# Altium footprint library 元件1.PcbLib: 420 footprints (part 18 of 27)
Each footprint in its own frame and in the unit in brackets; x right, y up, seen from the top. Pads: shape width x height; smd on the part's side, far side on the other; paste and mask are expansions set on the pad; w line width, h text height; cw(c..) or ccw(c..) is an arc to the next point about the centre after c.
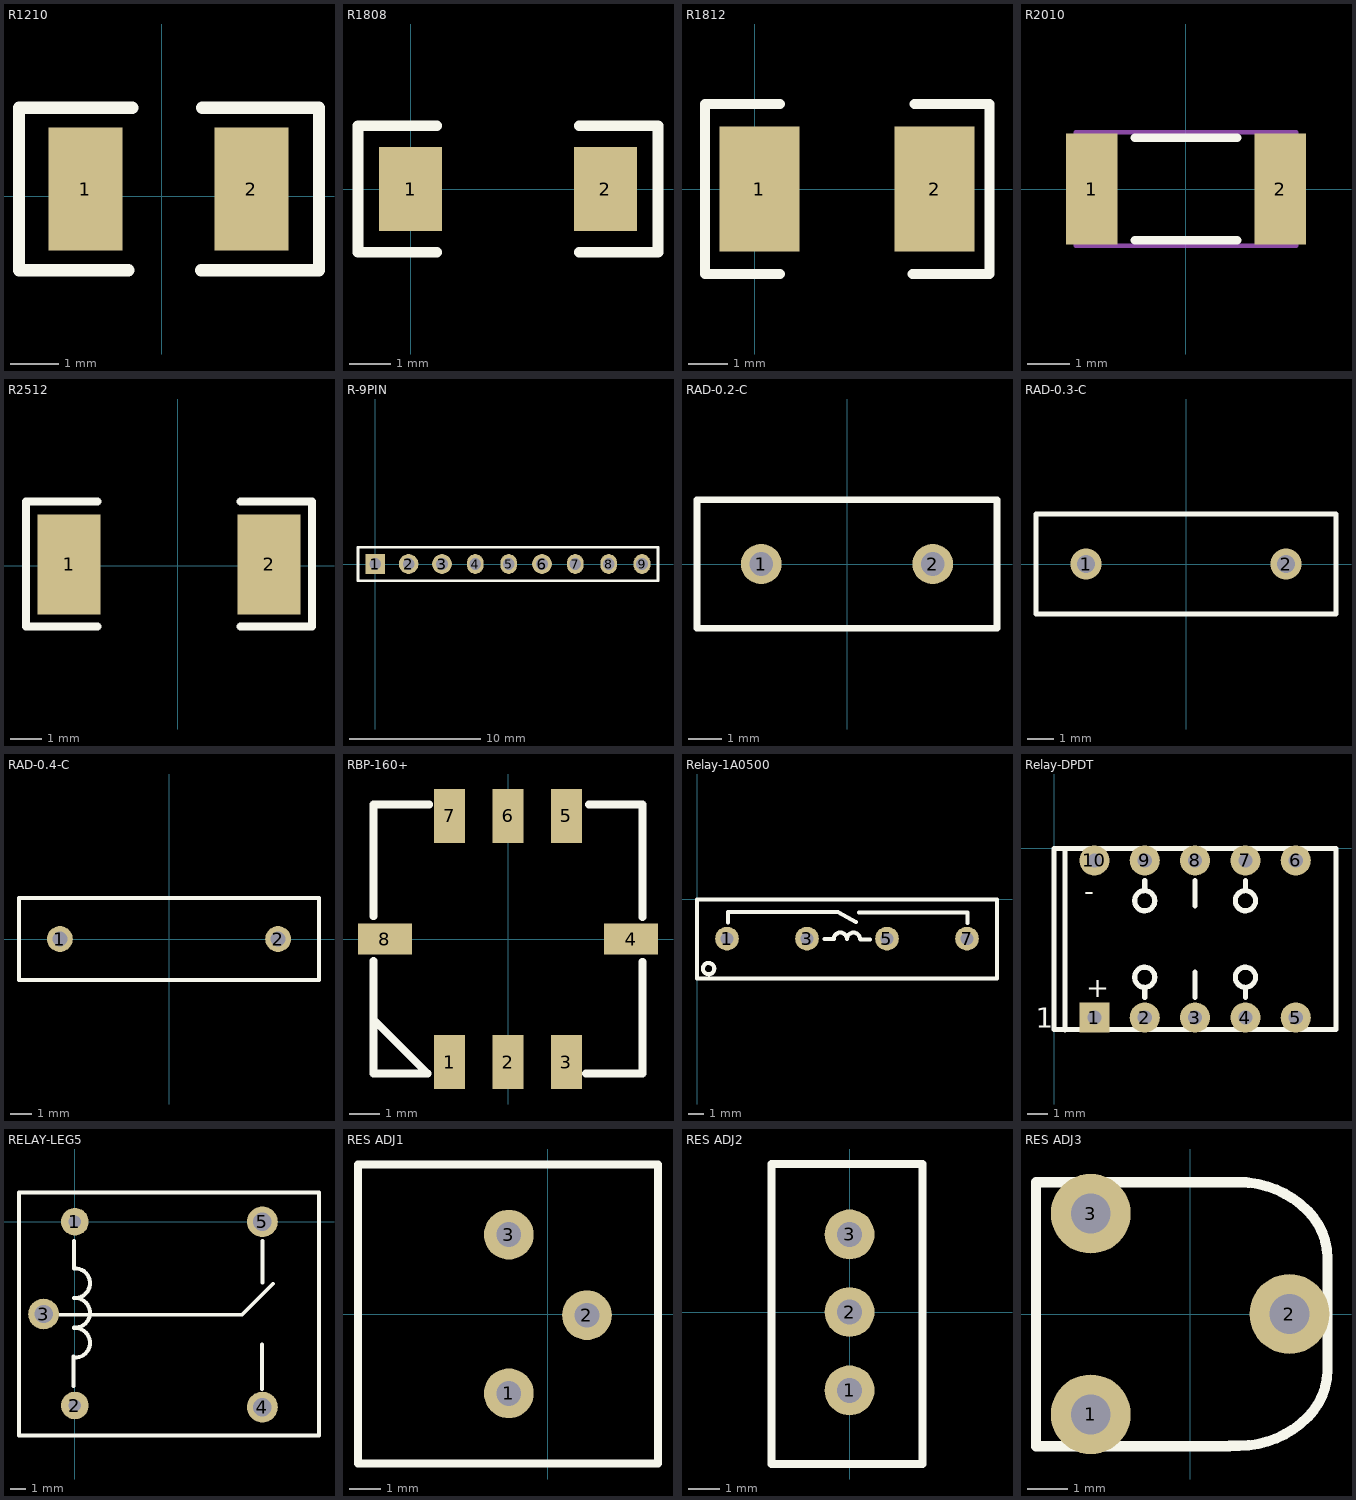
[diagram p17: the footprints below, top view; thin cyan lines are the x and y axes]

## R1210 [mil] "1/3W"
pads (2):
  rect 60x100 smd: 1(-62,6) 2(73,6)
Top Overlay:
  lines w10: -27,-60 -116,-60 -116,72 -24,72 ; 32,-60 128,-60 128,72 ; 33,72 126.8,72
3D body "1210(3225M) Cap.STEP": height 67.1, standoff 0, extent -72.75,-44 84.75,54

## R1808 [mil]
pads (2):
  rect 60x80 smd: 1(0,0) 2(185,0)
Top Overlay:
  lines w10: 25,-60 -50,-60 -50,60 25,60 ; 160,-60 235,-60 235,60 160,60
3D body "R1808(4520M)1.STEP": height 39.37, standoff 0, extent 2,-39 179.77,37.49

## R1812 [mil] "1/2W"
pads (2):
  rect 80x125 smd: 1(4.39,-0.02) 2(180,-0.02)
Top Overlay:
  lines w10: 25,-85 -50,-85 -50,85 25,85 ; 158,-85 160,-85 235,-85 235,85 160,85 ; 159,-85 161,-85
3D body "1812 SMD Resistor.step": height 63.07, standoff 0, extent 5.42,-62 182.58,63.98

## R2010 [mm] "3/4W"
height 0.9
pads (2):
  rect 1.2x2.6 smd: 1(-2.2,0) 2(2.2,0)
Top Overlay:
  lines w0.2: -1.2,-1.2 1.2,-1.2 ; -1.2,1.2 1.2,1.2
Mechanical 13:
  lines w0.1: -2.575,-1.325 -2.575,1.325 2.575,1.325 2.575,-1.325 -2.575,-1.325
3D body "User Library-res2010.STEP": height 0.57, standoff -0.05, extent -3,-1.35 3,1.35

## R2512 [mm] "1W"
height 0.9
pads (2):
  rect 2x3.2 smd: 1(-3.479,0.051) 2(2.921,0.051)
Top Overlay:
  lines w0.254: -2.565,-1.93 -4.851,-1.93 -4.851,2.057 -2.565,2.057 ; 2.007,-1.93 4.293,-1.93 4.293,2.057 2.007,2.057
3D body "RESC6432X06.step": height 0.6, standoff 0, extent -3.479,-1.549 2.921,1.651

## R-9PIN [mm]
pads (9):
  rect 1.5x1.5 hole 0.9: 1(0,0)
  round 1.5 hole 0.9: 2(2.54,0) 3(5.08,0) 6(12.7,0)
  oval 1.27x1.5 hole 0.9: 4(7.62,0) 5(10.16,0) 7(15.24,0) 8(17.78,0) 9(20.32,0)
Top Overlay:
  lines w0.2: -1.321,-1.27 -1.321,1.27 21.539,1.27 21.539,-1.27 -1.321,-1.27
3D body "pai zu.STEP": height 5.3, standoff -3.2, extent -1.012,-0.635 21.488,0.615

## RAD-0.2-C [mm] "Radial Cap, Thru-Hole; 2 Leads; 0.2 in Pin Spacing"
pads (2):
  round 1.2 hole 0.7: 1(-2.54,0) 2(2.54,0)
Top Overlay:
  lines w0.2: -4.445,-1.905 -4.445,1.905 4.445,1.905 4.445,-1.905 -4.445,-1.905
3D body "SW3dPS-capacitor-radial.STEP": height 6.14, standoff -1.48, extent -2.794,-1.016 2.794,1.27

## RAD-0.3-C [mm] "Radial Cap, Thru-Hole; 2 Leads; 0.3 in Pin Spacing"
height 6
pads (2):
  round 1.2 hole 0.7: 1(-3.81,0) 2(3.81,0)
Top Overlay:
  lines w0.2: -5.715,-1.905 5.715,-1.905 5.715,1.905 -5.715,1.905 -5.715,-1.905
3D body "User Library-RAD CAP 12_5MM.STEP": height 14.62, standoff -5.79, extent -6.377,-2.921 6.123,2.979

## RAD-0.4-C [mm] "Radial Cap, Thru-Hole; 2 Leads; 0.4 in Pin Spacing"
pads (2):
  round 1.2 hole 0.7: 1(-5.08,0) 2(5.08,0)
Top Overlay:
  lines w0.2: -6.985,-1.905 6.985,-1.905 6.985,1.905 -6.985,1.905 -6.985,-1.905
3D body "User Library-RAD CAP 12_5MM.STEP": height 16.47, standoff -3.94, extent -6.25,-2.979 6.25,2.921

## RBP-160+ [mm] "IF SAW FILTER"
height 5.33
pads (8):
  rect 1.02x1.78 smd: 1(-1.93,-4.065) 2(0,-4.065) 3(1.93,-4.065) 5(1.93,4.065) 6(0,4.065) 7(-1.93,4.065)
  rect 1.78x1.02 smd: 4(4.065,0) 8(-4.065,0)
Top Overlay:
  lines w0.254: -4.445,-4.191 -4.445,-0.725 ; -4.445,-3.275 -4.445,-4.445 -2.65,-4.445 -4.445,-2.65 -4.445,-2.325 ; -4.445,0.75 -4.445,4.445 -2.6,4.445 ; 2.575,-4.445 4.445,-4.445 4.445,-0.75 ; 2.675,4.445 4.191,4.445 4.445,4.445 ; 3.35,4.445 4.445,4.445 ; 4.445,0.725 4.445,4.445
3D body "RBP-275 .step": height 2.54, standoff 0, extent -4.455,-4.455 4.455,4.455

## Relay-1A0500 [mm]
pads (4):
  round 1.5 hole 0.8: 1(1.905,-2.489) 3(6.985,-2.489) 5(12.065,-2.489) 7(17.145,-2.489)
Top Overlay:
  circle w0.254: c0.737,-4.394 r0.359
  lines w0.254: 1.981,-1.473 1.981,-0.813 8.966,-0.813 10.109,-1.448 ; 8.103,-2.515 8.687,-2.515 cw(c9.093,-2.515) 9.093,-2.108 cw(c9.093,-2.54) 9.524,-2.516 ; 9.526,-2.515 cw(c9.932,-2.515) 9.932,-2.108 cw(c9.932,-2.54) 10.363,-2.516 ; 10.287,-0.838 17.17,-0.838 17.17,-1.499 ; 10.389,-2.54 10.973,-2.54 ; 0,-5.029 0,0 19.05,0 19.05,-5.029 0,-5.029
3D body "SIL03-1A72-71L_WEB.step": height 8.15, standoff -3.15, extent -0.374,-5.054 19.426,0.026

## Relay-DPDT [mm]
pads (10):
  rect 1.5x1.5 hole 0.7: 1(2,-8.4)
  round 1.5 hole 0.7: 2(4.5,-8.4) 3(7,-8.4) 4(9.5,-8.4) 5(12,-8.4) 6(12,-0.6) 7(9.5,-0.6) 8(7,-0.6) 9(4.5,-0.6) 10(2,-0.6)
Top Overlay:
  circle w0.254: c4.5,-2.6 r0.5
  circle w0.254: c9.5,-2.6 r0.5
  circle w0.254: c4.5,-6.4 r0.5
  circle w0.254: c9.5,-6.4 r0.5
  lines w0.254: 0.533,-9.017 0.533,-0.025 ; 4.5,-7.4 4.5,-6.9 ; 4.5,-2.1 4.5,-1.6 ; 7,-7.4 7,-6.15 ; 7,-2.85 7,-1.6 ; 9.5,-7.4 9.5,-6.9 ; 9.5,-2.1 9.5,-1.6 ; 0,-9 0,0 14,0 14,-9 0,-9
  text "+" at 1.6,-7.4 h1
  text "-" at 1.5,-2.6 h1
  text "1" at -0.9,-8.9 h1
3D body: height 5, standoff 0, extent 0,-9 14,0

## RELAY-LEG5 [mm]
pads (5):
  round 1.8 hole 0.8: 1(0,0) 2(0,-11.965)
  round 2 hole 1.2: 3(-2.032,-6.007) 4(12.217,-12.065) 5(12.217,0)
Top Overlay:
  lines w0.254: -0.965,-6.058 10.897,-6.058 12.916,-4.039 ; -0.076,-10.706 -0.076,-8.776 ; -0.051,-8.852 ccw(c0.021,-7.887) -0.04,-6.922 ; -0.051,-6.896 ccw(c0.021,-5.932) -0.04,-4.966 ; -0.051,-4.966 ccw(c0.021,-4.001) -0.04,-3.036 -0.04,-1.243 ; 12.192,-10.884 12.192,-7.988 ; 12.217,-3.95 12.217,-1.257 ; -3.632,-13.919 15.9,-13.919 15.9,1.905 -3.632,1.905 -3.632,-13.919
3D body "User Library-SONGLE Relay SRU-12VDC-SL-C.step": height 15.3, standoff -5, extent -3.403,-13.906 15.697,1.594

## RES ADJ1 [mm]
pads (3):
  round 1.6 hole 0.8: 1(-1.257,-2.553) 2(1.257,-0.038) 3(-1.257,2.553)
Top Overlay:
  lines w0.254: -6.109,-4.813 -6.109,4.813 3.543,4.813 3.543,-4.813 -6.109,-4.813
3D body "RES ADJUST.step": height 5, standoff -4.83, extent -6.073,-4.793 3.457,4.737

## RES ADJ2 [mm]
pads (3):
  round 1.6 hole 0.8: 1(0,-2.515) 2(0,0) 3(0,2.489)
Top Overlay:
  lines w0.254: -2.502,-4.877 -2.502,4.75 2.337,4.75 2.337,-4.877 -2.502,-4.877
3D body "3386W.step": height 9.53, standoff -5, extent -2.464,-4.828 2.366,4.701

## RES ADJ3 [mm]
pads (3):
  round 2 hole 1: 1(-2.489,-2.515) 2(2.489,0) 3(-2.489,2.515)
Top Overlay:
  lines w0.254: 0.991,-3.315 -3.861,-3.315 -3.861,3.302 1.397,3.302 ; 0.991,-3.302 1.229,-3.302 ccw(c1.229,-0.874) 2.946,-2.591 ccw(c1.751,-1.395) 3.442,-1.395 3.442,-1.372 ; 0.991,3.302 1.229,3.302 cw(c1.229,0.874) 2.946,2.591 cw(c1.751,1.395) 3.442,1.395 3.442,1.372 ; 3.442,-1.384 3.442,1.384
3D body "PA0630NOXOX-HA1.STEP": height 7.5, standoff -2, extent -3.754,-3.201 3.246,3.199